# Altium footprint library JL_PCB.PCBLIB: 1129 footprints (part 34 of 72)
Each footprint in its own frame and in the unit in brackets; x right, y up, seen from the top. Pads: shape width x height; smd on the part's side, far side on the other; paste and mask are expansions set on the pad; w line width, h text height; cw(c..) or ccw(c..) is an arc to the next point about the centre after c.
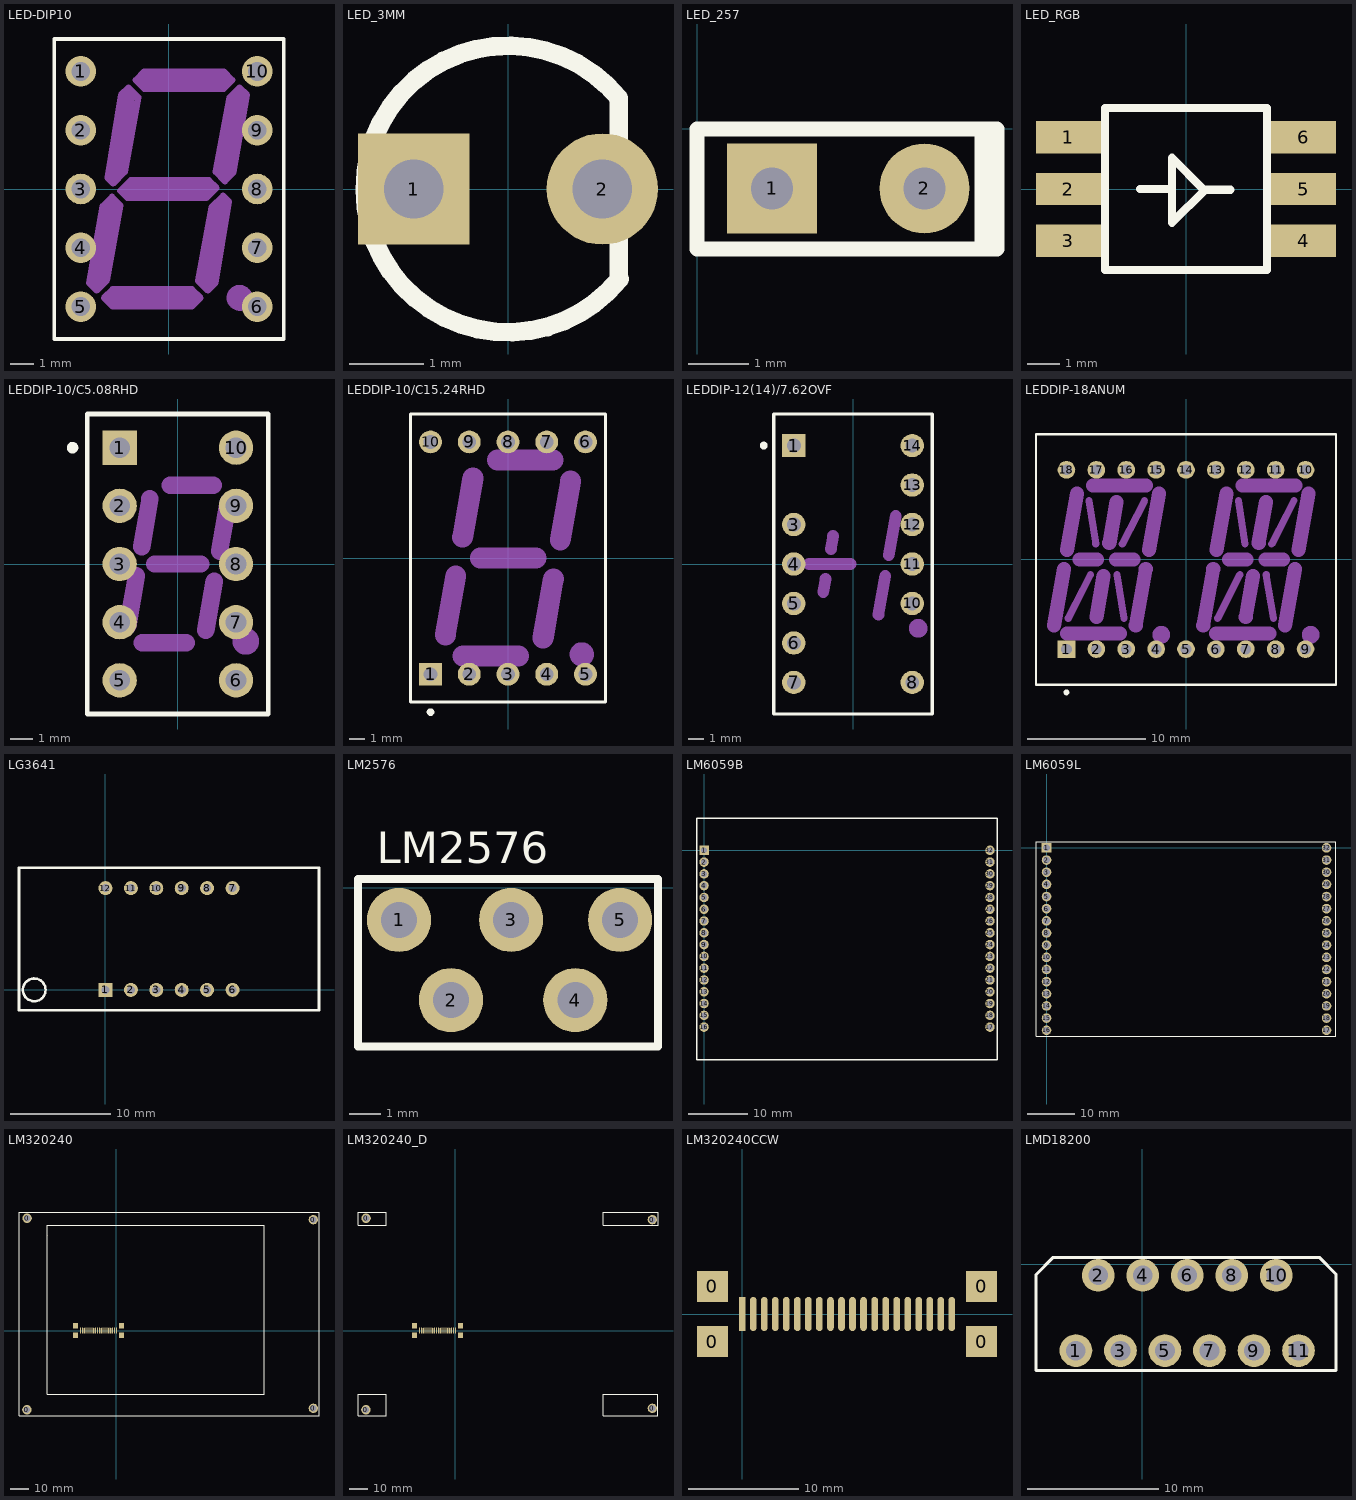
[diagram p33: the footprints below, top view; thin cyan lines are the x and y axes]

## LED-DIP10 [mil]
pads (10):
  round 52 hole 32: 1(-150,200) 2(-150,100) 3(-150,0) 4(-150,-100) 5(-150,-200) 6(150,-200) 7(150,-100) 8(150,0) 9(150,100) 10(150,200)
TopOverlay:
  lines w6: -195,-255 195,-255 195,255 -195,255 -195,-255
Mechanical1:
  circle w24: c120,-185 r10
  lines w10: -136,-160 -113,-29 -97,-13 -82,-28 -105,-155 -123,-173 -136,-160 ; -111,-185 -96,-170 39,-170 54,-185 39,-200 -96,-200 -111,-185 ; -105,19 -95,9 -75,29 -52,156 -69,173 -82,160 -105,19 ; -83,-3 -65,15 68,15 81,2 64,-15 -71,-15 -83,-3 ; -57,185 -42,170 93,170 108,185 93,200 -42,200 -57,185 ; 49,-156 72,-31 92,-11 102,-21 79,-160 66,-173 49,-156 ; 79,29 103,156 120,173 133,160 110,28 95,13 79,29
  lines w12: 115,-185 125,-185
  lines w24: -120,-155 -95,-25 ; -95,-185 40,-185 ; -90,25 -70,155 ; -70,0 65,0 ; -40,185 95,185 ; 65,-155 90,-25 ; 95,30 120,160
3D body "7段": height 279.53, standoff -255.91, extent -196.85,-255.91 196.85,255.91

## LED_3MM [mm]
pads (2):
  rect 1.5x1.5 hole 0.8: 1(-1.27,0)
  round 1.5 hole 0.8: 2(1.27,0)
TopOverlay:
  lines w0.254: 1.491,-1.201 1.491,1.225 ccw(c0,0) 1.502,-1.212

## LED_257 [mm]
pads (2):
  rect 1.5x1.5 hole 0.7: 1(1.25,-0.991)
  round 1.5 hole 0.7: 2(3.79,-0.991)
TopOverlay:
  lines w0.254: 4.75,-1.956 4.75,-0.025 ; 0,-2 5,-2 5,0 0,0 0,-2
3D body "LED-257.STEP": height 7.22, standoff -2.88, extent 0.065,-2.197 5.065,0.203

## LED_RGB [mm]
pads (6):
  rect 2x1 smd: 1(-3.632,1.6) 2(-3.632,0) 3(-3.632,-1.6) 4(3.632,-1.6) 5(3.632,0) 6(3.632,1.6)
TopOverlay:
  lines w0.254: -1.422,0 -0.432,0 ; 1.372,-0.025 0.584,-0.025 ; 0.584,-0.025 0.559,-0.025 -0.432,0.965 -0.432,-1.041 0.584,-0.025 ; -2.5,-2.5 -2.5,2.5 2.5,2.5 2.5,-2.5 -2.5,-2.5

## LEDDIP-10/C5.08RHD [mm] "LED, 7-Segment Display, 7.62 mm, RHD; 10 Leads; Row Space 5.08 mm; Pitch 2.54 mm"
height 6.34
pads (10):
  rect 1.5x1.5 hole 0.9: 1(-2.54,5.08)
  round 1.5 hole 0.9: 2(-2.54,2.54) 3(-2.54,0) 4(-2.54,-2.54) 5(-2.54,-5.08) 6(2.54,-5.08) 7(2.54,-2.54) 8(2.54,0) 9(2.54,2.54) 10(2.54,5.08)
TopOverlay:
  circle w0.25: c-4.6,5.08 r0.125
  lines w0.2: -3.95,-6.55 -3.95,6.55 3.95,6.55 3.95,-6.55 -3.95,-6.55
Mechanical1:
  circle w0.86: c2.97,-3.38 r0.15
  lines w0.762: -2.19,-2.69 -1.81,-0.52 ; -1.58,0.76 -1.22,2.84 ; -1.56,-3.43 0.36,-3.43 ; -1.004,0 1.004,0 ; -0.34,3.43 1.55,3.43 ; 1.22,-2.89 1.59,-0.76 ; 1.82,0.56 2.2,2.69
Mechanical13:
  lines w0.1: -3.95,-6.55 -3.95,6.55 3.95,6.55 3.95,-6.55 -3.95,-6.55
3D body: height 6.34, standoff 0, extent -3.95,-6.55 3.95,6.55

## LEDDIP-10/C15.24RHD [mm] "LED, 7-Segment Display, 14.2 mm, RHD; 10 Leads; Row Space 15.24 mm; Pitch 2.54 mm"
height 8.25
pads (10):
  rect 1.5x1.5 hole 0.9: 1(-5.08,-7.62)
  round 1.5 hole 0.9: 2(-2.54,-7.62) 3(0,-7.62) 4(2.54,-7.62) 5(5.08,-7.62) 6(5.08,7.62) 7(2.54,7.62) 8(0,7.62) 9(-2.54,7.62) 10(-5.08,7.62)
TopOverlay:
  circle w0.25: c-5.08,-10.1 r0.125
  lines w0.2: -6.4,-9.45 6.4,-9.45 6.4,9.45 -6.4,9.45 -6.4,-9.45
Mechanical1:
  circle w1: c4.842,-6.316 r0.296
  lines w1.37: -4.108,-5.054 -3.425,-1.17 ; -2.974,1.368 -2.293,5.255 ; -2.958,-6.429 0.692,-6.426 ; -1.821,0 1.828,0 ; -0.689,6.425 2.96,6.425 ; 2.295,-5.256 2.98,-1.371 ; 3.427,1.169 4.11,5.058
Mechanical13:
  lines w0.1: -6.4,-9.45 -6.4,9.45 6.4,9.45 6.4,-9.45 -6.4,-9.45
3D body: height 8.25, standoff 0, extent -6.4,-9.45 6.4,9.45

## LEDDIP-12(14)/7.62OVF [mm] "LED, Universal ? Overflow, 7.62 mm, RHD; 14 Leads (2 Absent); Row Space 7.62 mm; Pitch 2.54 mm"
height 6.35
pads (12):
  rect 1.5x1.5 hole 0.9: 1(-3.81,7.62)
  round 1.5 hole 0.9: 3(-3.81,2.54) 4(-3.81,0) 5(-3.81,-2.54) 6(-3.81,-5.08) 7(-3.81,-7.62) 8(3.81,-7.62) 10(3.81,-2.54) 11(3.81,0) 12(3.81,2.54) 13(3.81,5.08) 14(3.81,7.62)
TopOverlay:
  circle w0.25: c-5.75,7.62 r0.125
  lines w0.2: -5.1,-9.65 5.1,-9.65 5.1,9.65 -5.1,9.65 -5.1,-9.65
Mechanical1:
  circle w0.86: c4.19,-4.139 r0.17
  lines w0.762: -2.83,0 -0.17,0 ; -1.911,-1.799 -1.764,-0.962 ; -1.427,0.961 -1.28,1.8 ; 1.63,-3.262 2.071,-0.764 ; 2.303,0.565 2.747,3.084
Mechanical13:
  lines w0.1: -5.1,-9.65 -5.1,9.65 5.1,9.65 5.1,-9.65 -5.1,-9.65
3D body: height 6.35, standoff 0, extent -5.1,-9.65 5.1,9.65

## LEDDIP-18ANUM [mm] "LED, Alphanumeric Display, 13.8 mm, Dual Character; 18 Leads; Row Space 15.24 mm; Pitch 2.54 mm"
height 7.27
pads (18):
  rect 1.5x1.5 hole 0.9: 1(-10.16,-7.62)
  round 1.5 hole 0.9: 2(-7.62,-7.62) 3(-5.08,-7.62) 4(-2.54,-7.62) 5(0,-7.62) 6(2.54,-7.62) 7(5.08,-7.62) 8(7.62,-7.62) 9(10.16,-7.62) 10(10.16,7.62) 11(7.62,7.62) 12(5.08,7.62) 13(2.54,7.62) 14(0,7.62) 15(-2.54,7.62) 16(-5.08,7.62) 17(-7.62,7.62) 18(-10.16,7.62)
TopOverlay:
  circle w0.25: c-10.16,-11.3 r0.125
  lines w0.2: -12.75,-10.65 12.75,-10.65 12.75,10.65 -12.75,10.65 -12.75,-10.65
Mechanical1:
  circle w1.2: c-2.1,-6.4 r0.15
  circle w1.2: c10.6,-6.4 r0.15
  lines w0.6: -10.01,-5 -8.12,-1.3 ; -8.25,5 -7.67,1.3 ; -5.88,-1.3 -5.28,-5 ; -5.42,1.3 -3.52,5 ; 2.69,-5 4.58,-1.3 ; 4.45,5 5.03,1.3 ; 6.82,-1.3 7.42,-5 ; 7.28,1.3 9.18,5
  lines w1.2: -11.23,-5.6 -10.38,-0.8 ; -10.13,-6.3 -5.62,-6.3 ; -10.1,0.8 -9.26,5.58 ; -9.035,0 -7.58,0 ; -7.9,6.3 -3.39,6.3 ; -7.62,-4.89 -7.01,-1.4 ; -6.52,1.41 -5.91,4.89 ; -5.96,0 -4.465,0 ; -4.27,-5.6 -3.42,-0.8 ; -3.13,0.81 -2.3,5.59 ; 1.47,-5.6 2.32,-0.8 ; 2.57,-6.3 7.08,-6.3 ; 2.6,0.8 3.44,5.58 ; 3.665,0 5.14,0 ; 4.8,6.3 9.31,6.3 ; 5.08,-4.89 5.69,-1.4 ; 6.18,1.41 6.79,4.89 ; 6.76,0 8.235,0 ; 8.43,-5.6 9.28,-0.8 ; 9.57,0.81 10.4,5.59
Mechanical13:
  lines w0.1: -12.75,-10.65 -12.75,10.65 12.75,10.65 12.75,-10.65 -12.75,-10.65
3D body: height 7.27, standoff 0, extent -12.75,-10.65 12.75,10.65

## LG3641 [mil]
pads (12):
  rect 55x55 hole 32: 1(0,0)
  round 55 hole 32: 2(100,0) 3(200,0) 4(300,0) 5(400,0) 6(500,0) 7(500,400) 8(400,400) 9(300,400) 10(200,400) 11(100,400) 12(0,400)
TopOverlay:
  circle w10: c-280,0 r44.72
  lines w10: -340,-80 -200,-80 700,-80 840,-80 840,480 700,480 -200,480 -340,480 -340,-80

## LM2576 [mil]
pads (5):
  round 80 hole 45: 1(-759.76,-40) 2(-695,-140) 3(-620,-40) 4(-540,-140) 5(-484.17,-40)
TopOverlay:
  lines w10: -810.95,-197.79 -436.93,-197.79 -436.93,11.18 -810.95,11.18 -810.95,-197.79
  text "LM2576" at -787.32,30.87 h39.37

## LM6059B [mm]
pads (32):
  rect 1.6x1.6 hole 1: 1(0,0)
  round 1.6 hole 1: 2(0,-2) 3(0,-4) 4(0,-6) 5(0,-8) 6(0,-10) 7(0,-12) 8(0,-14) 9(0,-16) 10(0,-18) 11(0,-20) 12(0,-22) 13(0,-24) 14(0,-26) 15(0,-28) 16(0,-30) 17(48.5,-30) 18(48.5,-28) 19(48.5,-26) 20(48.5,-24) 21(48.5,-22) 22(48.5,-20) 23(48.5,-18) 24(48.5,-16) 25(48.5,-14) 26(48.5,-12) 27(48.5,-10) 28(48.5,-8) 29(48.5,-6) 30(48.5,-4) 31(48.5,-2) 32(48.5,0)
TopOverlay:
  lines w0.254: -1.2,-35.5 -1.2,5.4 49.7,5.4 49.7,-35.5 -1,-35.5 -1.2,-35.5

## LM6059L [mm]
pads (32):
  rect 2x2 hole 1.4: 1(0,0)
  round 2 hole 1.4: 2(0,-2.54) 3(0,-5.08) 4(0,-7.62) 5(0,-10.16) 6(0,-12.7) 7(0,-15.24) 8(0,-17.78) 9(0,-20.32) 10(0,-22.86) 11(0,-25.4) 12(0,-27.94) 13(0,-30.48) 14(0,-33.02) 15(0,-35.56) 16(0,-38.1) 17(58.5,-38.1) 18(58.5,-35.56) 19(58.5,-33.02) 20(58.5,-30.48) 21(58.5,-27.94) 22(58.5,-25.4) 23(58.5,-22.86) 24(58.5,-20.32) 25(58.5,-17.78) 26(58.5,-15.24) 27(58.5,-12.7) 28(58.5,-10.16) 29(58.5,-7.62) 30(58.5,-5.08) 31(58.5,-2.54) 32(58.5,0)
TopOverlay:
  lines w0.254: -1.27,-39.37 1.27,-39.37 ; -1.27,1.27 1.27,1.27 ; 57.23,-39.37 59.77,-39.37 ; 57.23,1.27 59.77,1.27 ; 60.47,1.27 60.17,1.27 -2.17,1.27 -2.2,1.3 -2.2,-39.04 -2.2,-39.37 60.47,-39.37 60.47,0.97 60.47,1.27 ; 60.47,1.27 60.47,1.27

## LM320240 [mm]
pads (28):
  round 5 hole 3.5: 0(-47.4,-41.95) 0(-47.3,59.55) 0(104.4,-41.2) 0(104.4,58.8)
  rect 2.8x2.8 smd: 0(-21.7,-2.5) 0(-21.7,2.5) 0(2.7,-2.5) 0(2.7,2.5)
  rect 0.6x3.1 smd: 1(0,0)
  oval 0.6x3.1 smd: 2(-1,0) 3(-2,0) 4(-3,0) 5(-4,0) 6(-5,0) 7(-6,0) 8(-7,0) 9(-8,0) 10(-9,0) 11(-10,0) 12(-11,0) 13(-12,0) 14(-13,0) 15(-14,0) 16(-15,0) 17(-16,0) 18(-17,0) 19(-18,0) 20(-19,0)
TopLayer:
  lines w0.254: -36.685,50.422 -36.68,50.417
TopOverlay:
  lines w0.254: -36.685,-33.65 -36.685,55.714 -36.685,50.414 ; -36.685,-33.635 -36.685,-33.634 -36.674,-33.645 78.485,-33.645 ; -36.664,55.735 78.485,55.735 78.485,-33.65 ; -51.6,-45.1 107.4,-45.1 107.4,59.5 107.4,62.7 -51.6,62.7 -51.6,-45.1

## LM320240_D [mm]
pads (28):
  round 5 hole 3.5: 0(-47.4,-41.95) 0(-47.3,59.55) 0(104.4,-41.2) 0(104.4,58.8)
  rect 2.8x2.8 smd: 0(-21.7,-2.5) 0(-21.7,2.5) 0(2.7,-2.5) 0(2.7,2.5)
  rect 0.6x3.1 smd: 1(0,0)
  oval 0.6x3.1 smd: 2(-1,0) 3(-2,0) 4(-3,0) 5(-4,0) 6(-5,0) 7(-6,0) 8(-7,0) 9(-8,0) 10(-9,0) 11(-10,0) 12(-11,0) 13(-12,0) 14(-13,0) 15(-14,0) 16(-15,0) 17(-16,0) 18(-17,0) 19(-18,0) 20(-19,0)
TopOverlay:
  lines w0.254: -36.685,-45.084 -36.685,-33.634 ; -36.685,-33.635 -36.685,-33.634 ; -36.685,55.714 -36.685,62.697 -36.688,62.7 -51.6,62.7 -51.6,55.762 ; -36.669,-45.1 -51.6,-45.1 -51.6,-33.651 -51.594,-33.645 -36.674,-33.645 -36.685,-33.634 ; -36.664,55.735 -51.573,55.735 ; -51.6,55.762 -51.573,55.735 ; -51.6,55.762 -51.573,55.735 ; 78.485,62.691 78.494,62.7 ; 78.485,62.691 78.494,62.7 ; 78.485,62.691 78.485,55.735 107.382,55.735 ; 78.494,62.7 107.4,62.7 107.4,59.5 107.4,55.753 ; 107.382,55.735 107.4,55.753 ; 107.382,55.735 107.4,55.753 ; 78.485,-45.072 78.485,-33.645 107.378,-33.645 107.372,-33.651 107.372,-45.072 78.485,-45.072

## LM320240CCW [mm]
pads (24):
  rect 2.8x2.8 smd: 0(-2.7,-2.5) 0(-2.7,2.5) 0(21.7,-2.5) 0(21.7,2.5)
  rect 0.6x3.1 smd: 1(0,0)
  oval 0.6x3.1 smd: 2(1,0) 3(2,0) 4(3,0) 5(4,0) 6(5,0) 7(6,0) 8(7,0) 9(8,0) 10(9,0) 11(10,0) 12(11,0) 13(12,0) 14(13,0) 15(14,0) 16(15,0) 17(16,0) 18(17,0) 19(18,0) 20(19,0)

## LMD18200 [mm]
pads (11):
  round 2.5 hole 1.5: 1(-5.08,-6.604) 2(-3.38,-0.858) 3(-1.68,-6.604) 4(0.02,-0.858) 5(1.72,-6.604) 6(3.42,-0.858) 7(5.12,-6.604) 8(6.82,-0.858) 9(8.52,-6.604) 10(10.22,-0.858) 11(11.92,-6.604)
TopOverlay:
  lines w0.254: -8.128,-8.128 -8.128,-0.813 -6.807,0.508 13.208,0.508 13.513,0.508 14.783,-0.762 14.783,-8.128 -8.128,-8.128